# Altium footprint library DebugBoard.PcbLib: 10 footprints
Each footprint in its own frame and in the unit in brackets; x right, y up, seen from the top. Pads: shape width x height; smd on the part's side, far side on the other; paste and mask are expansions set on the pad; w line width, h text height; cw(c..) or ccw(c..) is an arc to the next point about the centre after c.
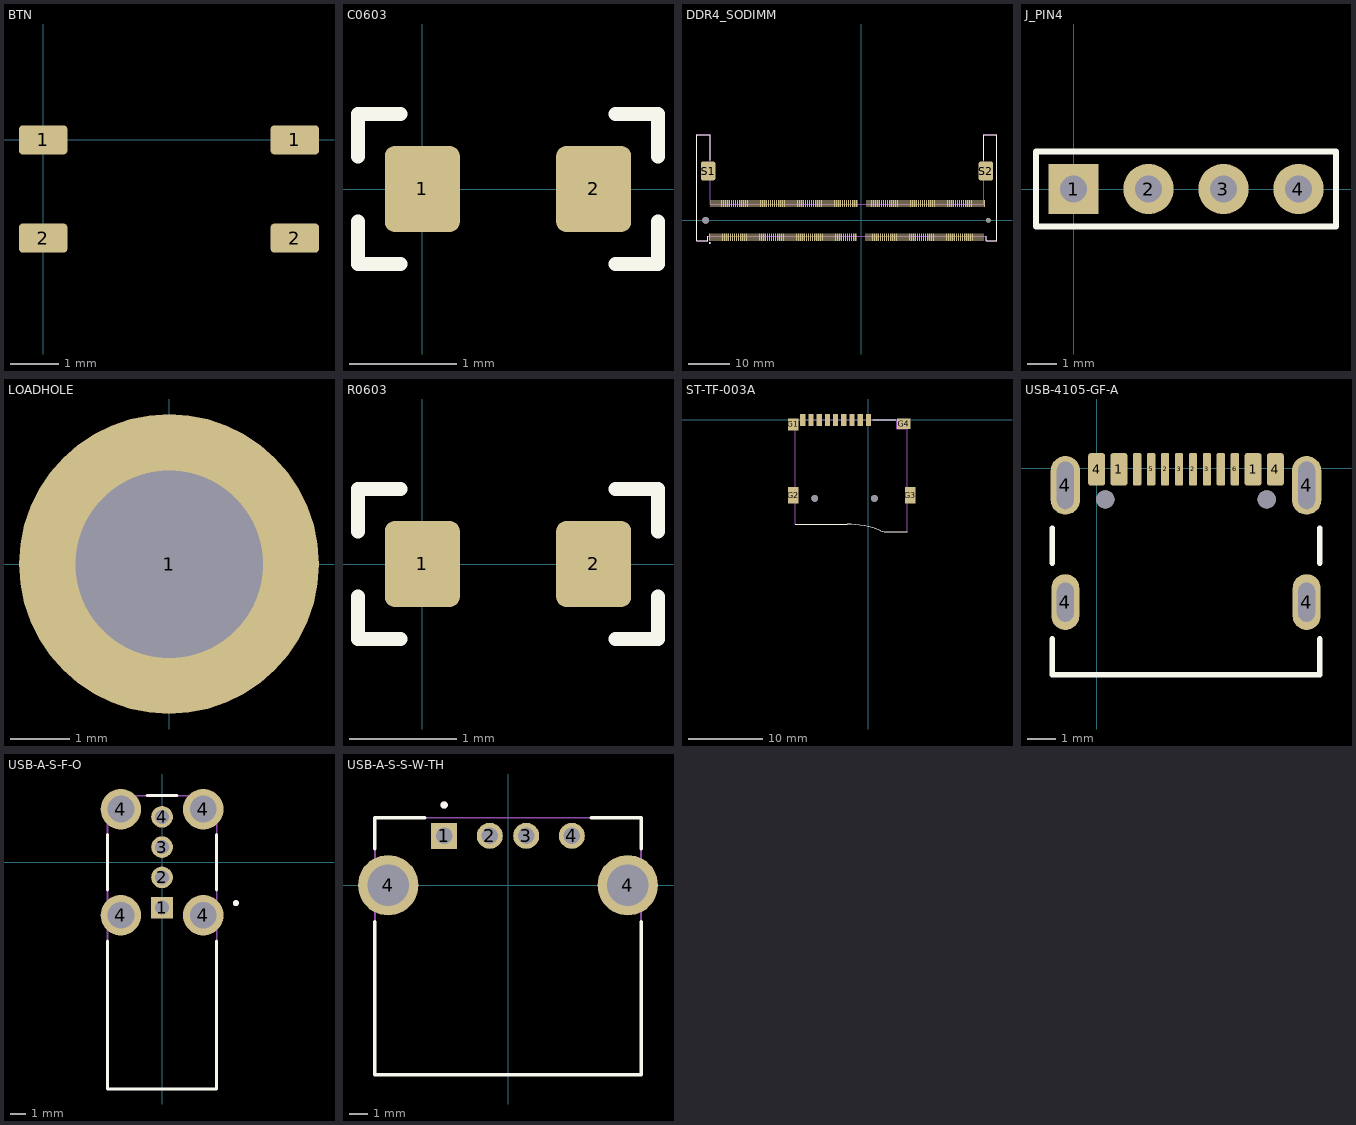
[diagram p0: the footprints below, top view; thin cyan lines are the x and y axes]

## BTN [mm]
pads (4):
  rrect25% 1x0.6 smd: 1(0,0) 1(5.207,0) 2(0,-2.032) 2(5.207,-2.032)
3D body: height 2.3, standoff 1.7, extent 1.67,-2.014 3.662,-0.023
3D body: height 2.3, standoff 1.7, extent 2.556,-2.016 4.556,-0.016
3D body: height 2.3, standoff 1.7, extent 0.778,-2.016 2.778,-0.016
3D body: height 1.7, standoff 0, extent 0.254,-2.413 5.08,0.381

## C0603 [mm]
pads (2):
  rrect25% 0.7x0.8 smd: 1(0,0) 2(1.6,0)
Top Overlay:
  lines w0.127: -0.6,-0.3 -0.6,-0.7 -0.2,-0.7 ; -0.6,0.3 -0.6,0.7 -0.2,0.7 ; 1.8,-0.7 2.2,-0.7 2.2,-0.3 ; 1.8,0.7 2.2,0.7 2.2,0.3
3D body "C 0603.STEP": height 0.81, standoff -0.01, extent 0,-0.41 1.6,0.41

## DDR4_SODIMM [mm]
pads (264):
  rrect25% 0.3x1.75 smd: 1(-36.875,-4.1) 2(-36.625,4.1) 3(-36.375,-4.1) 4(-36.125,4.1) 5(-35.875,-4.1) 6(-35.625,4.1) 7(-35.375,-4.1) 8(-35.125,4.1) 9(-34.875,-4.1) 10(-34.625,4.1) 11(-34.375,-4.1) 12(-34.125,4.1) 13(-33.875,-4.1) 14(-33.625,4.1) 15(-33.375,-4.1) 16(-33.125,4.1) 17(-32.875,-4.1) 18(-32.625,4.1) 19(-32.375,-4.1) 20(-32.125,4.1) 21(-31.875,-4.1) 22(-31.625,4.1) 23(-31.375,-4.1) 24(-31.125,4.1) 25(-30.875,-4.1) 26(-30.625,4.1) 27(-30.375,-4.1) 28(-30.125,4.1) 29(-29.875,-4.1) 30(-29.625,4.1) 31(-29.375,-4.1) 32(-29.125,4.1) 33(-28.875,-4.1) 34(-28.625,4.1) 35(-28.375,-4.1) 36(-28.125,4.1) 37(-27.875,-4.1) 38(-27.625,4.1) 39(-27.375,-4.1) 40(-27.125,4.1) 41(-26.875,-4.1) 42(-26.625,4.1) 43(-26.375,-4.1) 44(-26.125,4.1) 45(-25.875,-4.1) 46(-25.625,4.1) 47(-25.375,-4.1) 48(-25.125,4.1) 49(-24.875,-4.1) 50(-24.625,4.1) 51(-24.375,-4.1) 52(-24.125,4.1) 53(-23.875,-4.1) 54(-23.625,4.1) 55(-23.375,-4.1) 56(-23.125,4.1) 57(-22.875,-4.1) 58(-22.625,4.1) 59(-22.375,-4.1) 60(-22.125,4.1) 61(-21.875,-4.1) 62(-21.625,4.1) 63(-21.375,-4.1) 64(-21.125,4.1) 65(-20.875,-4.1) 66(-20.625,4.1) 67(-20.375,-4.1) 68(-20.125,4.1) 69(-19.875,-4.1) 70(-19.625,4.1) 71(-19.375,-4.1) 72(-19.125,4.1) 73(-18.875,-4.1) 74(-18.625,4.1) 75(-18.375,-4.1) 76(-18.125,4.1) 77(-17.875,-4.1) 78(-17.625,4.1) 79(-17.375,-4.1) 80(-17.125,4.1) 81(-16.875,-4.1) 82(-16.625,4.1) 83(-16.375,-4.1) 84(-16.125,4.1) 85(-15.875,-4.1) 86(-15.625,4.1) 87(-15.375,-4.1) 88(-15.125,4.1) 89(-14.875,-4.1) 90(-14.625,4.1) 91(-14.375,-4.1) 92(-14.125,4.1) 93(-13.875,-4.1) 94(-13.625,4.1) 95(-13.375,-4.1) 96(-13.125,4.1) 97(-12.875,-4.1) 98(-12.625,4.1) 99(-12.375,-4.1) 100(-12.125,4.1) 101(-11.875,-4.1) 102(-11.625,4.1) 103(-11.375,-4.1) 104(-11.125,4.1) 105(-10.875,-4.1) 106(-10.625,4.1) 107(-10.375,-4.1) 108(-10.125,4.1) 109(-9.875,-4.1) 110(-9.625,4.1) 111(-9.375,-4.1) 112(-9.125,4.1) 113(-8.875,-4.1) 114(-8.625,4.1) 115(-8.375,-4.1) 116(-8.125,4.1) 117(-7.875,-4.1) 118(-7.625,4.1) 119(-7.375,-4.1) 120(-7.125,4.1) 121(-6.875,-4.1) 122(-6.625,4.1) 123(-6.375,-4.1) 124(-6.125,4.1) 125(-5.875,-4.1) 126(-5.625,4.1) 127(-5.375,-4.1) 128(-5.125,4.1) 129(-4.875,-4.1) 130(-4.625,4.1) 131(-4.375,-4.1) 132(-4.125,4.1) 133(-3.875,-4.1) 134(-3.625,4.1) 135(-3.375,-4.1) 136(-3.125,4.1) 137(-2.875,-4.1) 138(-2.625,4.1) 139(-2.375,-4.1) 140(-2.125,4.1) 141(-1.875,-4.1) 142(-1.625,4.1) 143(-1.375,-4.1) 144(-1.125,4.1) 145(1.125,-4.1) 146(1.375,4.1) 147(1.625,-4.1) 148(1.875,4.1) 149(2.125,-4.1) 150(2.375,4.1) 151(2.625,-4.1) 152(2.875,4.1) 153(3.125,-4.1) 154(3.375,4.1) 155(3.625,-4.1) 156(3.875,4.1) 157(4.125,-4.1) 158(4.375,4.1) 159(4.625,-4.1) 160(4.875,4.1) 161(5.125,-4.1) 162(5.375,4.1) 163(5.625,-4.1) 164(5.875,4.1) 165(6.125,-4.1) 166(6.375,4.1) 167(6.625,-4.1) 168(6.875,4.1) 169(7.125,-4.1) 170(7.375,4.1) 171(7.625,-4.1) 172(7.875,4.1) 173(8.125,-4.1) 174(8.375,4.1) 175(8.625,-4.1) 176(8.875,4.1) 177(9.125,-4.1) 178(9.375,4.1) 179(9.625,-4.1) 180(9.875,4.1) 181(10.125,-4.1) 182(10.375,4.1) 183(10.625,-4.1) 184(10.875,4.1) 185(11.125,-4.1) 186(11.375,4.1) 187(11.625,-4.1) 188(11.875,4.1) 189(12.125,-4.1) 190(12.375,4.1) 191(12.625,-4.1) 192(12.875,4.1) 193(13.125,-4.1) 194(13.375,4.1) 195(13.625,-4.1) 196(13.875,4.1) 197(14.125,-4.1) 198(14.375,4.1) 199(14.625,-4.1) 200(14.875,4.1) 201(15.125,-4.1) 202(15.375,4.1) 203(15.625,-4.1) 204(15.875,4.1) 205(16.125,-4.1) 206(16.375,4.1) 207(16.625,-4.1) 208(16.875,4.1) 209(17.125,-4.1) 210(17.375,4.1) 211(17.625,-4.1) 212(17.875,4.1) 213(18.125,-4.1) 214(18.375,4.1) 215(18.625,-4.1) 216(18.875,4.1) 217(19.125,-4.1) 218(19.375,4.1) 219(19.625,-4.1) 220(19.875,4.1) 221(20.125,-4.1) 222(20.375,4.1) 223(20.625,-4.1) 224(20.875,4.1) 225(21.125,-4.1) 226(21.375,4.1) 227(21.625,-4.1) 228(21.875,4.1) 229(22.125,-4.1) 230(22.375,4.1) 231(22.625,-4.1) 232(22.875,4.1) 233(23.125,-4.1) 234(23.375,4.1) 235(23.625,-4.1) 236(23.875,4.1) 237(24.125,-4.1) 238(24.375,4.1) 239(24.625,-4.1) 240(24.875,4.1) 241(25.125,-4.1) 242(25.375,4.1) 243(25.625,-4.1) 244(25.875,4.1) 245(26.125,-4.1) 246(26.375,4.1) 247(26.625,-4.1) 248(26.875,4.1) 249(27.125,-4.1) 250(27.375,4.1) 251(27.625,-4.1) 252(27.875,4.1) 253(28.125,-4.1) 254(28.375,4.1) 255(28.625,-4.1) 256(28.875,4.1) 257(29.125,-4.1) 258(29.375,4.1) 259(29.625,-4.1) 260(29.875,4.1)
  rrect25% 3.5x4.6 smd: S1(-37.3,12) S2(30.3,12)
  round 1.65 hole 1.65 unplated: ""(-37.9,0)
  round 1.15 hole 1.15 unplated: ""(30.9,0)
Top Overlay:
  circle w0.2: c-36.875,-5.5 r0.1
  lines w0.127: -37.4,-3.9 -37.4,-5 -40,-5 -40,20.85 -36.73,20.85 -36.73,14.62 ; 29.73,14.62 29.73,20.85 33,20.85 33,-5 30.4,-5 30.4,-3.9
Mechanical 13:
  circle w0.2: c-36.875,-5.5 r0.1
  lines w0.127: -40,-5 -40,20.85 -36.73,20.85 -36.73,3.9 29.73,3.9 29.73,20.85 33,20.85 33,-5 30.4,-5 30.4,-3.9 -37.4,-3.9 -37.4,-5 -40,-5
3D body "2309409-1.stp": height 4.81, standoff -0.73, extent -39.929,-4.895 33.071,20.955
3D body "Board.step": height 4.3, standoff 0.9, extent -38.229,-0.536 31.371,29.464

## J_PIN4 [mm]
pads (4):
  rect 1.7x1.7 hole 0.9: 1(0,0)
  round 1.7 hole 0.9: 2(2.54,0) 3(5.08,0) 4(7.62,0)
Top Overlay:
  lines w0.2: -1.27,-1.27 8.89,-1.27 8.89,1.27 -1.27,1.27 -1.27,-1.27
3D body "HDR2.54-1P.STEP": height 8.5, standoff -3, extent 6.35,-1.27 8.89,1.27
3D body "HDR2.54-1P.STEP": height 8.5, standoff -3, extent 3.81,-1.27 6.35,1.27
3D body "HDR2.54-1P.STEP": height 8.5, standoff -3, extent 1.27,-1.27 3.81,1.27
3D body "HDR2.54-1P.STEP": height 8.5, standoff -3, extent -1.27,-1.27 1.27,1.27

## LOADHOLE [mm]
pads (1):
  round 5.08 hole 3.175: 1(0,0)
3D body "M3x10.STEP": height 10.05, standoff 0.05, extent -2.698,-2.35 2.698,2.35

## R0603 [mm]
pads (2):
  rrect25% 0.7x0.8 smd: 1(0,0) 2(1.6,0)
Top Overlay:
  lines w0.127: -0.6,-0.3 -0.6,-0.7 -0.2,-0.7 ; -0.6,0.3 -0.6,0.7 -0.2,0.7 ; 1.8,-0.7 2.2,-0.7 2.2,-0.3 ; 1.8,0.7 2.2,0.7 2.2,0.3
3D body "R 0603.STEP": height 0.4, standoff 0, extent 0,-0.4 1.6,0.4

## ST-TF-003A [mm]
pads (15):
  rect 0.7x1.6 smd: 1(0,0) 2(-1.1,0) 3(-2.2,0) 4(-3.3,0) 5(-4.4,0) 6(-5.5,0) 7(-6.6,0) 8(-7.7,0) 9(-8.8,0)
  rect 1.4x1.6 smd: G1(-10.1,-0.6)
  rect 1.4x2.2 smd: G2(-10.1,-10.1) G3(5.6,-10.1)
  rect 1.8x1.4 smd: G4(4.7,-0.5)
  round 0.9 hole 0.9 unplated: ""(-7.2,-10.5) ""(0.8,-10.5)
Top Overlay:
  lines w0.127: -9.807,-13.97 -2.873,-13.97 cw(c-2.873,-26.67) 1.678,-14.814 ; 0.55,0 3.65,0 ; 1.641,-14.799 ccw(c2.648,-12.177) 2.648,-14.986 5.179,-14.986
Mechanical 13:
  lines w0.127: -9.807,-13.97 -9.807,0 3.782,0 3.782,-1.143 5.179,-1.143 5.179,-14.986

## USB-4105-GF-A [mm]
pads (18):
  rrect25% 0.6x1.15 smd: 1(0.8,-0.045) 1(5.6,-0.045) 4(0,-0.045) 4(6.4,-0.045)
  rrect25% 0.3x1.15 smd: 2(2.45,-0.045) 2(3.45,-0.045) 3(2.95,-0.045) 3(3.95,-0.045) 5(1.95,-0.045) 6(4.95,-0.045) ""(1.45,-0.045) ""(4.45,-0.045)
  oval 1x2 hole 0.6 slot 1.4 at 90 deg: 4(-1.12,-4.8) 4(7.52,-4.8)
  oval 1.05x2.1 hole 0.6 slot 1.7 at 90 deg: 4(-1.12,-0.62) 4(7.52,-0.62)
  round 0.65 hole 0.65 unplated: ""(0.31,-1.12) ""(6.09,-1.12)
Top Overlay:
  lines w0.2: -1.59,-6.12 -1.59,-7.4 7.99,-7.4 7.99,-6.12 ; -1.59,-3.4 -1.59,-2.15 ; 7.99,-3.4 7.99,-2.15
3D body "USB4105_GF_A.STEP": height 3.31, standoff -0.85, extent -1.59,-7.4 7.99,0.31

## USB-A-S-F-O [mm]
pads (8):
  rect 1.428x1.428 hole 0.92: 1(0,-3)
  round 1.428 hole 0.92: 2(0,-1) 3(0,1) 4(0,3)
  round 2.67 hole 1.78: 4(-2.72,-3.5) 4(-2.72,3.5) 4(2.72,-3.5) 4(2.72,3.5)
Top Overlay:
  circle w0.2: c4.875,-2.7 r0.1
  lines w0.2: -3.6,-5.2 -3.6,-14.97 3.6,-14.97 3.6,-5.2 ; -3.6,-1.84 -3.6,1.84 ; -1,4.4 1,4.4 ; 3.6,-1.84 3.6,1.84
Mechanical 13:
  circle w0.2: c4.875,-2.7 r0.1
  lines w0.1: -3.6,-14.97 -3.6,4.4 3.6,4.4 3.6,-14.97 -3.6,-14.97
3D body "USBR-A-S-F-O-VU.STEP": height 14.87, standoff -3.33, extent -3.556,-15.061 3.644,4.139

## USB-A-S-S-W-TH [mm]
pads (6):
  rect 1.428x1.428 hole 0.92: 1(-3.5,2.71)
  round 1.428 hole 0.92: 2(-1,2.71) 3(1,2.71) 4(3.5,2.71)
  round 3.316 hole 2.3: 4(-6.57,0) 4(6.57,0)
Top Overlay:
  circle w0.2: c-3.5,4.4 r0.1
  lines w0.2: -7.3,-2.01 -7.3,-10.4 7.3,-10.4 7.3,-2.01 ; -7.3,2.01 -7.3,3.7 -4.565,3.7 ; 4.565,3.7 7.3,3.7 7.3,2.01
Mechanical 13:
  circle w0.2: c-3.5,4.4 r0.1
  lines w0.1: -7.3,-10.4 7.3,-10.4 7.3,3.7 -7.3,3.7 -7.3,-10.4
3D body "USB-A-S-S-W-TH.stp": height 7.47, standoff -4.42, extent -7.874,-10.352 7.874,3.748